# Altium schematic symbol library Diodes - TVS.SchLib: 5379 symbols (part 8 of 35)
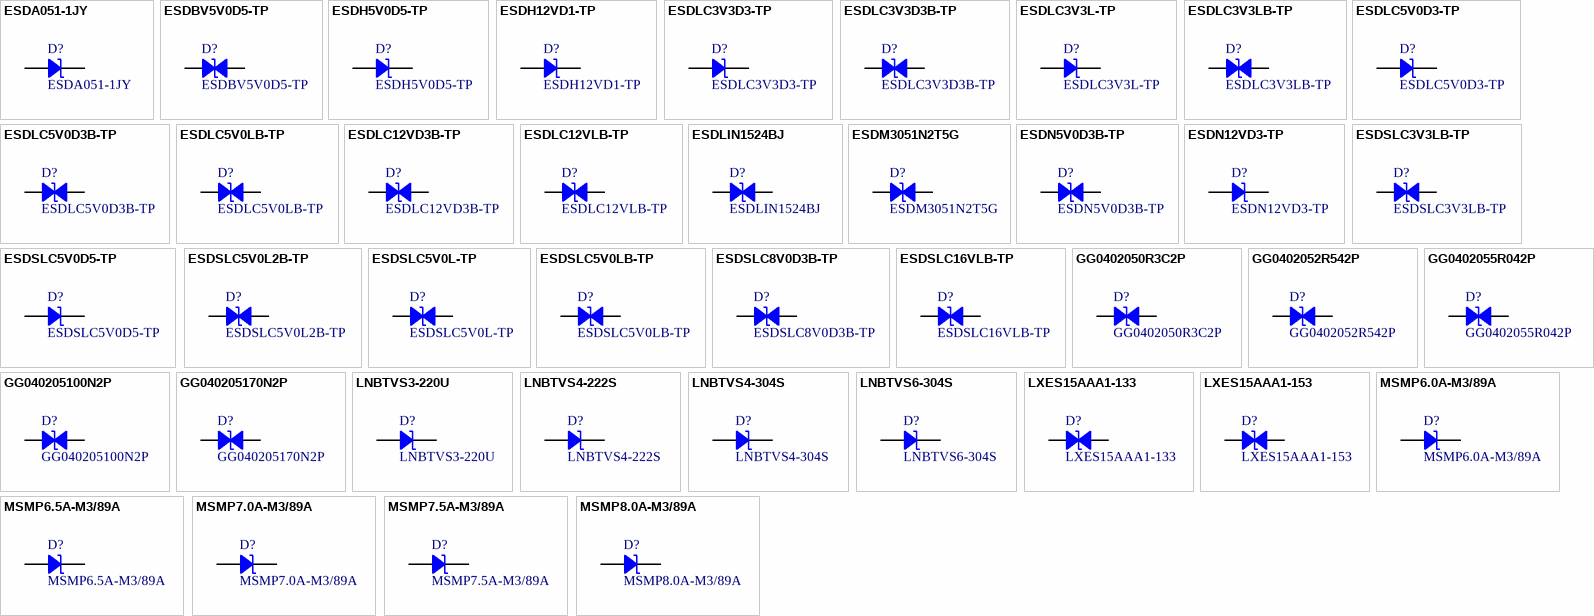
[diagram p141: symbols ESDA051-1JY to MSMP8.0A-M3/89A]

## MSMP8.0A-M3/89A
designator D?
TVS DIODE 8VWM 13.6VC MICROSMP; Manufacturer: Vishay Semiconductor Diodes Division; Current - Peak Pulse (10/1000µs): 11A; Power Line Protection: No; Power - Peak Pulse: 150W; Type: Zener; Unidirectional Channels: 1; Voltage - Breakdown (Min): 8.89V; Voltage - Clamping (Max) @ Ipp: 13.6V; Voltage - Reverse Standoff (Typ): 8V; Part Number: MSMP8.0A-M3/89A; Applications: General Purpose; ComponentLink1Description: Datasheet; ComponentLink1URL: http://www.vishay.com/docs/89457/msmp6athrumsmp20a.pdf; ComponentLink2Description: DigiKey Link; ComponentLink2URL: http://digikey.com/product-detail/en/vishay-semiconductor-diodes-division/MSMP8.0A-M3-89A/MSMP8.0A-M3-89AGICT-ND/8535698; Device Package: MicroSMP; LastUpdated: 9/2/2020 1:28:32 AM; Lifecycle Status: Active; Minimum Order: 1; Mounting Type: Surface Mount; Operating Temperature: -55°C ~ 150°C (TJ); Package / Case: MicroSMP; Packaging: TapeAndReel; PartId: 10006; Part Status: Active; Price: 0.07; Series: TransZorb®; Supplier 1: DigiKey; Supplier Part Number 1: MSMP8.0A-M3/89AGICT-ND; Supplier Device Package: MicroSMP
footprint DO-219AD MicroSMP
pins: 1, 2

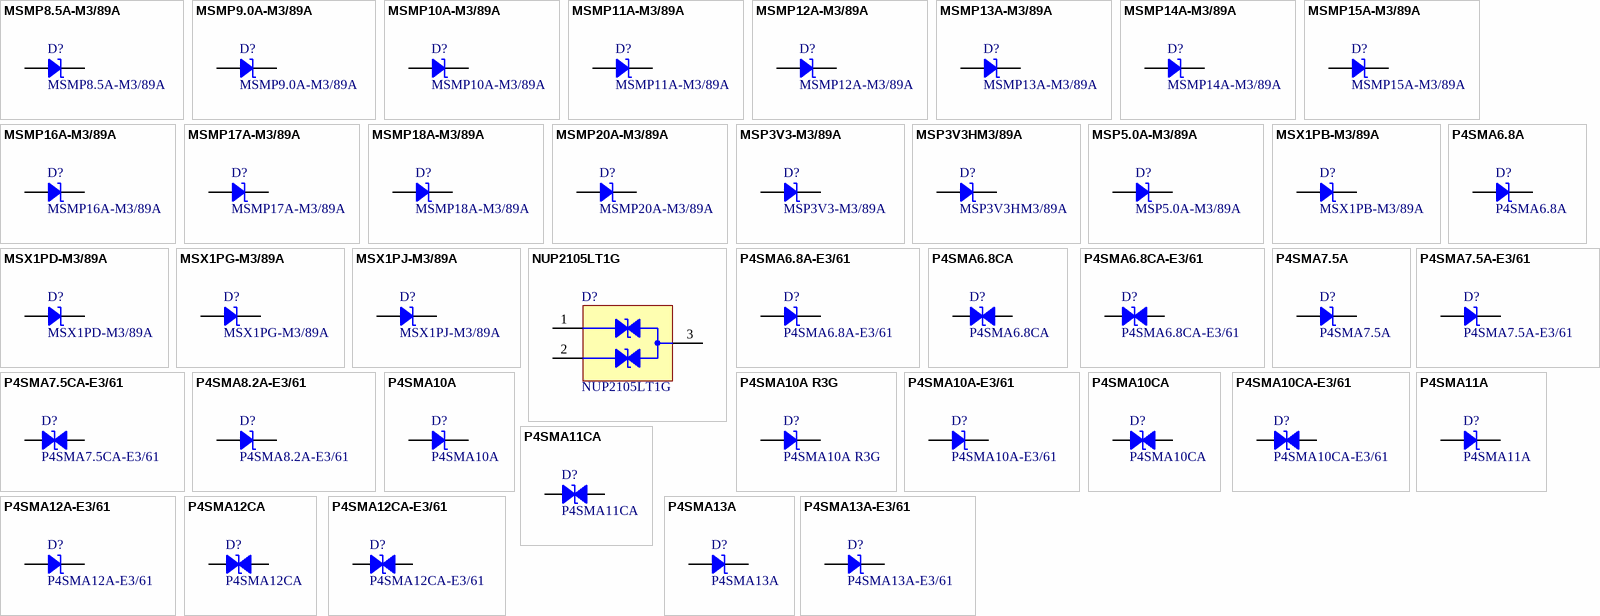
[diagram p26: symbols MSMP8.5A-M3/89A to P4SMA13A-E3/61]

## MSMP8.5A-M3/89A
designator D?
TVS DIODE 8.5VWM 14.4VC MICROSMP; Manufacturer: Vishay Semiconductor Diodes Division; Current - Peak Pulse (10/1000µs): 10.4A; Power Line Protection: No; Power - Peak Pulse: 150W; Type: Zener; Unidirectional Channels: 1; Voltage - Breakdown (Min): 9.44V; Voltage - Clamping (Max) @ Ipp: 14.4V; Voltage - Reverse Standoff (Typ): 8.5V; Part Number: MSMP8.5A-M3/89A; Applications: General Purpose; ComponentLink1Description: Datasheet; ComponentLink1URL: http://www.vishay.com/docs/89457/msmp6athrumsmp20a.pdf; ComponentLink2Description: DigiKey Link; ComponentLink2URL: http://digikey.com/product-detail/en/vishay-semiconductor-diodes-division/MSMP8.5A-M3-89A/MSMP8.5A-M3-89AGICT-ND/8535699; Device Package: MicroSMP; LastUpdated: 9/2/2020 1:28:32 AM; Lifecycle Status: Active; Minimum Order: 1; Mounting Type: Surface Mount; Operating Temperature: -55°C ~ 150°C (TJ); Package / Case: MicroSMP; Packaging: TapeAndReel; PartId: 10010; Part Status: Active; Price: 0.06; Series: TransZorb®; Supplier 1: DigiKey; Supplier Part Number 1: MSMP8.5A-M3/89AGICT-ND; Supplier Device Package: MicroSMP
footprint DO-219AD MicroSMP
pins: 1, 2

## MSMP9.0A-M3/89A
designator D?
TVS DIODE 9VWM 15.4VC MICROSMP; Manufacturer: Vishay Semiconductor Diodes Division; Current - Peak Pulse (10/1000µs): 9.7A; Power Line Protection: No; Power - Peak Pulse: 150W; Type: Zener; Unidirectional Channels: 1; Voltage - Breakdown (Min): 10V; Voltage - Clamping (Max) @ Ipp: 15.4V; Voltage - Reverse Standoff (Typ): 9V; Part Number: MSMP9.0A-M3/89A; Applications: General Purpose; ComponentLink1Description: Datasheet; ComponentLink1URL: http://www.vishay.com/docs/89457/msmp6athrumsmp20a.pdf; ComponentLink2Description: DigiKey Link; ComponentLink2URL: http://digikey.com/product-detail/en/vishay-semiconductor-diodes-division/MSMP9.0A-M3-89A/MSMP9.0A-M3-89AGICT-ND/8535700; Device Package: MicroSMP; LastUpdated: 9/2/2020 1:28:32 AM; Lifecycle Status: Active; Minimum Order: 1; Mounting Type: Surface Mount; Operating Temperature: -55°C ~ 150°C (TJ); Package / Case: MicroSMP; Packaging: TapeAndReel; PartId: 10009; Part Status: Active; Price: 0.06; Series: TransZorb®; Supplier 1: DigiKey; Supplier Part Number 1: MSMP9.0A-M3/89AGICT-ND; Supplier Device Package: MicroSMP
footprint DO-219AD MicroSMP
pins: 1, 2

## MSMP10A-M3/89A
designator D?
TVS DIODE 10VWM 17VC MICROSMP; Manufacturer: Vishay Semiconductor Diodes Division; Current - Peak Pulse (10/1000µs): 8.8A; Power Line Protection: No; Power - Peak Pulse: 150W; Type: Zener; Unidirectional Channels: 1; Voltage - Breakdown (Min): 11.1V; Voltage - Clamping (Max) @ Ipp: 17V; Voltage - Reverse Standoff (Typ): 10V; Part Number: MSMP10A-M3/89A; Applications: General Purpose; ComponentLink1Description: Datasheet; ComponentLink1URL: http://www.vishay.com/docs/89457/msmp6athrumsmp20a.pdf; ComponentLink2Description: DigiKey Link; ComponentLink2URL: http://digikey.com/product-detail/en/vishay-semiconductor-diodes-division/MSMP10A-M3-89A/MSMP10A-M3-89AGICT-ND/8535684; Device Package: MicroSMP; LastUpdated: 9/2/2020 1:28:32 AM; Lifecycle Status: Active; Minimum Order: 1; Mounting Type: Surface Mount; Operating Temperature: -55°C ~ 150°C (TJ); Package / Case: MicroSMP; Packaging: TapeAndReel; PartId: 10017; Part Status: Active; Price: 0.06; Series: TransZorb®; Supplier 1: DigiKey; Supplier Part Number 1: MSMP10A-M3/89AGICT-ND; Supplier Device Package: MicroSMP
footprint DO-219AD MicroSMP
pins: 1, 2

## MSMP11A-M3/89A
designator D?
TVS DIODE 11VWM 18.2VC MICROSMP; Manufacturer: Vishay Semiconductor Diodes Division; Current - Peak Pulse (10/1000µs): 8.2A; Power Line Protection: No; Power - Peak Pulse: 150W; Type: Zener; Unidirectional Channels: 1; Voltage - Breakdown (Min): 12.2V; Voltage - Clamping (Max) @ Ipp: 18.2V; Voltage - Reverse Standoff (Typ): 11V; Part Number: MSMP11A-M3/89A; Applications: General Purpose; ComponentLink1Description: Datasheet; ComponentLink1URL: http://www.vishay.com/docs/89457/msmp6athrumsmp20a.pdf; ComponentLink2Description: DigiKey Link; ComponentLink2URL: http://digikey.com/product-detail/en/vishay-semiconductor-diodes-division/MSMP11A-M3-89A/MSMP11A-M3-89AGICT-ND/8535685; Device Package: MicroSMP; LastUpdated: 9/2/2020 1:28:32 AM; Lifecycle Status: Active; Minimum Order: 1; Mounting Type: Surface Mount; Operating Temperature: -55°C ~ 150°C (TJ); Package / Case: MicroSMP; Packaging: TapeAndReel; PartId: 10019; Part Status: Active; Price: 0.06; Series: TransZorb®; Supplier 1: DigiKey; Supplier Part Number 1: MSMP11A-M3/89AGICT-ND; Supplier Device Package: MicroSMP
footprint DO-219AD MicroSMP
pins: 1, 2

## MSMP12A-M3/89A
designator D?
TVS DIODE 12VWM 19.9VC MICROSMP; Manufacturer: Vishay Semiconductor Diodes Division; Current - Peak Pulse (10/1000µs): 7.5A; Power Line Protection: No; Power - Peak Pulse: 150W; Type: Zener; Unidirectional Channels: 1; Voltage - Breakdown (Min): 13.3V; Voltage - Clamping (Max) @ Ipp: 19.9V; Voltage - Reverse Standoff (Typ): 12V; Part Number: MSMP12A-M3/89A; Applications: General Purpose; ComponentLink1Description: Datasheet; ComponentLink1URL: http://www.vishay.com/docs/89457/msmp6athrumsmp20a.pdf; ComponentLink2Description: DigiKey Link; ComponentLink2URL: http://digikey.com/product-detail/en/vishay-semiconductor-diodes-division/MSMP12A-M3-89A/MSMP12A-M3-89AGICT-ND/8535686; Device Package: MicroSMP; LastUpdated: 9/2/2020 1:28:32 AM; Lifecycle Status: Active; Minimum Order: 1; Mounting Type: Surface Mount; Operating Temperature: -55°C ~ 150°C (TJ); Package / Case: MicroSMP; Packaging: TapeAndReel; PartId: 10016; Part Status: Active; Price: 0.06; Series: TransZorb®; Supplier 1: DigiKey; Supplier Part Number 1: MSMP12A-M3/89AGICT-ND; Supplier Device Package: MicroSMP
footprint DO-219AD MicroSMP
pins: 1, 2

## MSMP13A-M3/89A
designator D?
TVS DIODE 13VWM 21.5VC MICROSMP; Manufacturer: Vishay Semiconductor Diodes Division; Current - Peak Pulse (10/1000µs): 7A; Power Line Protection: No; Power - Peak Pulse: 150W; Type: Zener; Unidirectional Channels: 1; Voltage - Breakdown (Min): 14.4V; Voltage - Clamping (Max) @ Ipp: 21.5V; Voltage - Reverse Standoff (Typ): 13V; Part Number: MSMP13A-M3/89A; Applications: General Purpose; ComponentLink1Description: Datasheet; ComponentLink1URL: http://www.vishay.com/docs/89457/msmp6athrumsmp20a.pdf; ComponentLink2Description: DigiKey Link; ComponentLink2URL: http://digikey.com/product-detail/en/vishay-semiconductor-diodes-division/MSMP13A-M3-89A/MSMP13A-M3-89AGICT-ND/8535687; Device Package: MicroSMP; LastUpdated: 9/2/2020 1:28:32 AM; Lifecycle Status: Active; Minimum Order: 1; Mounting Type: Surface Mount; Operating Temperature: -55°C ~ 150°C (TJ); Package / Case: MicroSMP; Packaging: TapeAndReel; PartId: 10015; Part Status: Active; Price: 0.06; Series: TransZorb®; Supplier 1: DigiKey; Supplier Part Number 1: MSMP13A-M3/89AGICT-ND; Supplier Device Package: MicroSMP
footprint DO-219AD MicroSMP
pins: 1, 2

## MSMP14A-M3/89A
designator D?
TVS DIODE 14VWM 23.2VC MICROSMP; Manufacturer: Vishay Semiconductor Diodes Division; Current - Peak Pulse (10/1000µs): 6.5A; Power Line Protection: No; Power - Peak Pulse: 150W; Type: Zener; Unidirectional Channels: 1; Voltage - Breakdown (Min): 15.6V; Voltage - Clamping (Max) @ Ipp: 23.2V; Voltage - Reverse Standoff (Typ): 14V; Part Number: MSMP14A-M3/89A; Applications: General Purpose; ComponentLink1Description: Datasheet; ComponentLink1URL: http://www.vishay.com/docs/89457/msmp6athrumsmp20a.pdf; ComponentLink2Description: DigiKey Link; ComponentLink2URL: http://digikey.com/product-detail/en/vishay-semiconductor-diodes-division/MSMP14A-M3-89A/MSMP14A-M3-89AGICT-ND/8535688; Device Package: MicroSMP; LastUpdated: 9/2/2020 1:28:32 AM; Lifecycle Status: Active; Minimum Order: 1; Mounting Type: Surface Mount; Operating Temperature: -55°C ~ 150°C (TJ); Package / Case: MicroSMP; Packaging: TapeAndReel; PartId: 10014; Part Status: Active; Price: 0.06; Series: TransZorb®; Supplier 1: DigiKey; Supplier Part Number 1: MSMP14A-M3/89AGICT-ND; Supplier Device Package: MicroSMP
footprint DO-219AD MicroSMP
pins: 1, 2

## MSMP15A-M3/89A
designator D?
TVS DIODE 15VWM 24.4VC MICROSMP; Manufacturer: Vishay Semiconductor Diodes Division; Current - Peak Pulse (10/1000µs): 6.2A; Power Line Protection: No; Power - Peak Pulse: 150W; Type: Zener; Unidirectional Channels: 1; Voltage - Breakdown (Min): 16.7V; Voltage - Clamping (Max) @ Ipp: 24.4V; Voltage - Reverse Standoff (Typ): 15V; Part Number: MSMP15A-M3/89A; Applications: General Purpose; ComponentLink1Description: Datasheet; ComponentLink1URL: http://www.vishay.com/docs/89457/msmp6athrumsmp20a.pdf; ComponentLink2Description: DigiKey Link; ComponentLink2URL: http://digikey.com/product-detail/en/vishay-semiconductor-diodes-division/MSMP15A-M3-89A/MSMP15A-M3-89AGICT-ND/8535689; Device Package: MicroSMP; LastUpdated: 9/2/2020 1:28:32 AM; Lifecycle Status: Active; Minimum Order: 1; Mounting Type: Surface Mount; Operating Temperature: -55°C ~ 150°C (TJ); Package / Case: MicroSMP; Packaging: TapeAndReel; PartId: 10013; Part Status: Active; Price: 0.06; Series: TransZorb®; Supplier 1: DigiKey; Supplier Part Number 1: MSMP15A-M3/89AGICT-ND; Supplier Device Package: MicroSMP
footprint DO-219AD MicroSMP
pins: 1, 2

## MSMP16A-M3/89A
designator D?
TVS DIODE 16VWM 26VC MICROSMP; Manufacturer: Vishay Semiconductor Diodes Division; Current - Peak Pulse (10/1000µs): 5.8A; Power Line Protection: No; Power - Peak Pulse: 150W; Type: Zener; Unidirectional Channels: 1; Voltage - Breakdown (Min): 17.8V; Voltage - Clamping (Max) @ Ipp: 26V; Voltage - Reverse Standoff (Typ): 16V; Part Number: MSMP16A-M3/89A; Applications: General Purpose; ComponentLink1Description: Datasheet; ComponentLink1URL: http://www.vishay.com/docs/89457/msmp6athrumsmp20a.pdf; ComponentLink2Description: DigiKey Link; ComponentLink2URL: http://digikey.com/product-detail/en/vishay-semiconductor-diodes-division/MSMP16A-M3-89A/MSMP16A-M3-89AGICT-ND/8535690; Device Package: MicroSMP; LastUpdated: 9/2/2020 1:28:32 AM; Lifecycle Status: Active; Minimum Order: 1; Mounting Type: Surface Mount; Operating Temperature: -55°C ~ 150°C (TJ); Package / Case: MicroSMP; Packaging: TapeAndReel; PartId: 10012; Part Status: Active; Price: 0.06; Series: TransZorb®; Supplier 1: DigiKey; Supplier Part Number 1: MSMP16A-M3/89AGICT-ND; Supplier Device Package: MicroSMP
footprint DO-219AD MicroSMP
pins: 1, 2

## MSMP17A-M3/89A
designator D?
TVS DIODE 17VWM 27.6VC MICROSMP; Manufacturer: Vishay Semiconductor Diodes Division; Current - Peak Pulse (10/1000µs): 5.4A; Power Line Protection: No; Power - Peak Pulse: 150W; Type: Zener; Unidirectional Channels: 1; Voltage - Breakdown (Min): 18.9V; Voltage - Clamping (Max) @ Ipp: 27.6V; Voltage - Reverse Standoff (Typ): 17V; Part Number: MSMP17A-M3/89A; Applications: General Purpose; ComponentLink1Description: Datasheet; ComponentLink1URL: http://www.vishay.com/docs/89457/msmp6athrumsmp20a.pdf; ComponentLink2Description: DigiKey Link; ComponentLink2URL: http://digikey.com/product-detail/en/vishay-semiconductor-diodes-division/MSMP17A-M3-89A/MSMP17A-M3-89AGICT-ND/8535691; Device Package: MicroSMP; LastUpdated: 9/2/2020 1:28:32 AM; Lifecycle Status: Active; Minimum Order: 1; Mounting Type: Surface Mount; Operating Temperature: -55°C ~ 150°C (TJ); Package / Case: MicroSMP; Packaging: TapeAndReel; PartId: 10011; Part Status: Active; Price: 0.06; Series: TransZorb®; Supplier 1: DigiKey; Supplier Part Number 1: MSMP17A-M3/89AGICT-ND; Supplier Device Package: MicroSMP
footprint DO-219AD MicroSMP
pins: 1, 2

## MSMP18A-M3/89A
designator D?
TVS DIODE 18VWM 29.2VC MICROSMP; Manufacturer: Vishay Semiconductor Diodes Division; Current - Peak Pulse (10/1000µs): 5.1A; Power Line Protection: No; Power - Peak Pulse: 150W; Type: Zener; Unidirectional Channels: 1; Voltage - Breakdown (Min): 20V; Voltage - Clamping (Max) @ Ipp: 29.2V; Voltage - Reverse Standoff (Typ): 18V; Part Number: MSMP18A-M3/89A; Applications: General Purpose; ComponentLink1Description: Datasheet; ComponentLink1URL: http://www.vishay.com/docs/89457/msmp6athrumsmp20a.pdf; ComponentLink2Description: DigiKey Link; ComponentLink2URL: http://digikey.com/product-detail/en/vishay-semiconductor-diodes-division/MSMP18A-M3-89A/MSMP18A-M3-89AGICT-ND/8535692; Device Package: MicroSMP; LastUpdated: 9/2/2020 1:28:32 AM; Lifecycle Status: Active; Minimum Order: 1; Mounting Type: Surface Mount; Operating Temperature: -55°C ~ 150°C (TJ); Package / Case: MicroSMP; Packaging: TapeAndReel; PartId: 10020; Part Status: Active; Price: 0.06; Series: TransZorb®; Supplier 1: DigiKey; Supplier Part Number 1: MSMP18A-M3/89AGICT-ND; Supplier Device Package: MicroSMP
footprint DO-219AD MicroSMP
pins: 1, 2

## MSMP20A-M3/89A
designator D?
TVS DIODE 20VWM 32.4VC MICROSMP; Manufacturer: Vishay Semiconductor Diodes Division; Current - Peak Pulse (10/1000µs): 4.6A; Power Line Protection: No; Power - Peak Pulse: 150W; Type: Zener; Unidirectional Channels: 1; Voltage - Breakdown (Min): 22.2V; Voltage - Clamping (Max) @ Ipp: 32.4V; Voltage - Reverse Standoff (Typ): 20V; Part Number: MSMP20A-M3/89A; Applications: General Purpose; ComponentLink1Description: Datasheet; ComponentLink1URL: http://www.vishay.com/docs/89457/msmp6athrumsmp20a.pdf; ComponentLink2Description: DigiKey Link; ComponentLink2URL: http://digikey.com/product-detail/en/vishay-semiconductor-diodes-division/MSMP20A-M3-89A/MSMP20A-M3-89AGICT-ND/8535693; Device Package: MicroSMP; LastUpdated: 9/2/2020 1:28:32 AM; Lifecycle Status: Active; Minimum Order: 1; Mounting Type: Surface Mount; Operating Temperature: -55°C ~ 150°C (TJ); Package / Case: MicroSMP; Packaging: TapeAndReel; PartId: 10018; Part Status: Active; Price: 0.06; Series: TransZorb®; Supplier 1: DigiKey; Supplier Part Number 1: MSMP20A-M3/89AGICT-ND; Supplier Device Package: MicroSMP
footprint DO-219AD MicroSMP
pins: 1, 2

## MSP3V3-M3/89A
designator D?
TVS DIODE 3.3V 11.5V MICROSMP; Manufacturer: Vishay Semiconductor Diodes Division; Current - Peak Pulse (10/1000µs): 87A (8/20µs); Power Line Protection: No; Power - Peak Pulse: 150W; Type: Zener; Unidirectional Channels: 1; Voltage - Breakdown (Min): 4.1V; Part Number: MSP3V3-M3/89A; Applications: General Purpose; ComponentLink1Description: Datasheet; ComponentLink1URL: http://www.vishay.com/docs/88486/msp3v3.pdf; ComponentLink2Description: DigiKey Link; ComponentLink2URL: http://digikey.com/product-detail/en/vishay-semiconductor-diodes-division/MSP3V3-M3-89A/MSP3V3-M3-89AGICT-ND/2071756; LastUpdated: 9/2/2020 1:28:32 AM; Lifecycle Status: Active; Minimum Order: 1; Mounting Type: Surface Mount; Operating Temperature: -55°C ~ 150°C (TJ); Package / Case: DO-219AD; Packaging: TapeAndReel; PartId: 10002; Part Status: Active; Price: 0.06; Series: TransZorb®, eSMP®; Supplier 1: DigiKey; Supplier Part Number 1: MSP3V3-M3/89AGICT-ND; Supplier Device Package: MicroSMP (DO-219AD); Voltage - Clamping (Max) @ Ipp: 11.5V; Voltage - Reverse Standoff (Typ): 3.3V
footprint DO-219AD MicroSMP
pins: 1, 2

## MSP3V3HM3/89A
designator D?
TVS DIODE 3.3V 11.5V MICROSMP; Manufacturer: Vishay Semiconductor Diodes Division; Current - Peak Pulse (10/1000µs): 87A (8/20µs); Power Line Protection: No; Power - Peak Pulse: 150W; Type: Zener; Unidirectional Channels: 1; Voltage - Breakdown (Min): 4.1V; Part Number: MSP3V3HM3/89A; Applications: Automotive; ComponentLink1Description: Datasheet; ComponentLink1URL: http://www.vishay.com/docs/88486/msp3v3.pdf; ComponentLink2Description: DigiKey Link; ComponentLink2URL: http://digikey.com/product-detail/en/vishay-semiconductor-diodes-division/MSP3V3HM3-89A/MSP3V3HM3-89AGICT-ND/8284101; LastUpdated: 9/2/2020 1:28:32 AM; Lifecycle Status: Active; Minimum Order: 1; Mounting Type: Surface Mount; Operating Temperature: -55°C ~ 150°C (TJ); Package / Case: DO-219AD; Packaging: TapeAndReel; PartId: 9997; Part Status: Active; Price: 0.07; Series: Automotive, AEC-Q101, TransZorb®, eSMP™; Supplier 1: DigiKey; Supplier Part Number 1: MSP3V3HM3/89AGICT-ND; Supplier Device Package: MicroSMP (DO-219AD); Voltage - Clamping (Max) @ Ipp: 11.5V; Voltage - Reverse Standoff (Typ): 3.3V
footprint DO-219AD MicroSMP
pins: 1, 2

## MSP5.0A-M3/89A
designator D?
TVS DIODE 5V 10.9V MICROSMP; Manufacturer: Vishay Semiconductor Diodes Division; Current - Peak Pulse (10/1000µs): 10.9A; Power Line Protection: No; Power - Peak Pulse: 100W; Type: Zener; Unidirectional Channels: 1; Voltage - Breakdown (Min): 6.4V; Part Number: MSP5.0A-M3/89A; Applications: General Purpose; ComponentLink1Description: Datasheet; ComponentLink1URL: //media.digikey.com/pdf/Data%20Sheets/Vishay%20Semiconductors/MSP5.0A.pdf; ComponentLink2Description: DigiKey Link; ComponentLink2URL: http://digikey.com/product-detail/en/vishay-semiconductor-diodes-division/MSP5.0A-M3-89A/MSP5.0A-M3-89AGICT-ND/2071757; Device Package: MicroSMP; LastUpdated: 9/2/2020 1:28:32 AM; Lifecycle Status: Active; Minimum Order: 1; Mounting Type: Surface Mount; Operating Temperature: -55°C ~ 150°C (TJ); Package / Case: MicroSMP; Packaging: TapeAndReel; PartId: 10003; Part Status: Active; Price: 0.07; Series: TransZorb®, eSMP®; Supplier 1: DigiKey; Supplier Part Number 1: MSP5.0A-M3/89AGICT-ND; Supplier Device Package: MicroSMP; Voltage - Clamping (Max) @ Ipp: 10.9V; Voltage - Reverse Standoff (Typ): 5V
footprint DO-219AD MicroSMP
pins: 1, 2

## MSX1PB-M3/89A
designator D?
TVS DIODE 100V MICROSMP; Manufacturer: Vishay Semiconductor Diodes Division; Power Line Protection: No; Type: Zener; Unidirectional Channels: 1; Part Number: MSX1PB-M3/89A; Applications: General Purpose; ComponentLink1Description: Datasheet; ComponentLink1URL: http://www.vishay.com/docs/87726/msx1pb-msx1pd-msx1pg-msx1pj.pdf; ComponentLink2Description: DigiKey Link; ComponentLink2URL: http://digikey.com/product-detail/en/vishay-semiconductor-diodes-division/MSX1PB-M3-89A/MSX1PB-M3-89AGICT-ND/8535701; LastUpdated: 9/2/2020 1:28:32 AM; Lifecycle Status: Active; Minimum Order: 1; Mounting Type: Surface Mount; Operating Temperature: -55°C ~ 175°C (TJ); Package / Case: DO-219AD; Packaging: TapeAndReel; PartId: 9998; Part Status: Active; Price: 0.07; Series: eSMP®; Supplier 1: DigiKey; Supplier Part Number 1: MSX1PB-M3/89AGICT-ND; Supplier Device Package: MicroSMP (DO-219AD); Voltage - Reverse Standoff (Typ): 100V
footprint DO-219AD MicroSMP
pins: 1, 2

## MSX1PD-M3/89A
designator D?
TVS DIODE 200VWM; Manufacturer: Vishay Semiconductor Diodes Division; Power Line Protection: No; Type: Zener; Unidirectional Channels: 1; Voltage - Reverse Standoff (Typ): 200V; Part Number: MSX1PD-M3/89A; Applications: General Purpose; ComponentLink1Description: Datasheet; ComponentLink1URL: http://www.vishay.com/docs/87726/msx1pb-msx1pd-msx1pg-msx1pj.pdf; ComponentLink2Description: DigiKey Link; ComponentLink2URL: http://digikey.com/product-detail/en/vishay-semiconductor-diodes-division/MSX1PD-M3-89A/MSX1PD-M3-89AGICT-ND/8535702; LastUpdated: 9/2/2020 1:28:32 AM; Lifecycle Status: Active; Minimum Order: 1; Mounting Type: Surface Mount; Operating Temperature: -55°C ~ 175°C (TJ); Package / Case: DO-219AD; Packaging: TapeAndReel; PartId: 10005; Part Status: Active; Price: 0.07; Series: eSMP®; Supplier 1: DigiKey; Supplier Part Number 1: MSX1PD-M3/89AGICT-ND; Supplier Device Package: MicroSMP (DO-219AD)
footprint DO-219AD MicroSMP
pins: 1, 2

## MSX1PG-M3/89A
designator D?
TVS DIODE 400VWM; Manufacturer: Vishay Semiconductor Diodes Division; Power Line Protection: No; Type: Zener; Unidirectional Channels: 1; Voltage - Reverse Standoff (Typ): 400V; Part Number: MSX1PG-M3/89A; Applications: General Purpose; ComponentLink1Description: Datasheet; ComponentLink1URL: http://www.vishay.com/docs/87726/msx1pb-msx1pd-msx1pg-msx1pj.pdf; ComponentLink2Description: DigiKey Link; ComponentLink2URL: http://digikey.com/product-detail/en/vishay-semiconductor-diodes-division/MSX1PG-M3-89A/MSX1PG-M3-89AGICT-ND/8535703; LastUpdated: 9/2/2020 1:28:32 AM; Lifecycle Status: Active; Minimum Order: 1; Mounting Type: Surface Mount; Operating Temperature: -55°C ~ 175°C (TJ); Package / Case: DO-219AD; Packaging: TapeAndReel; PartId: 10004; Part Status: Active; Price: 0.07; Series: eSMP®; Supplier 1: DigiKey; Supplier Part Number 1: MSX1PG-M3/89AGICT-ND; Supplier Device Package: MicroSMP (DO-219AD)
footprint DO-219AD MicroSMP
pins: 1, 2

## MSX1PJ-M3/89A
designator D?
TVS DIODE 600VWM; Manufacturer: Vishay Semiconductor Diodes Division; Power Line Protection: No; Type: Zener; Unidirectional Channels: 1; Voltage - Reverse Standoff (Typ): 600V; Part Number: MSX1PJ-M3/89A; Applications: General Purpose; ComponentLink1Description: Datasheet; ComponentLink1URL: http://www.vishay.com/docs/87726/msx1pb-msx1pd-msx1pg-msx1pj.pdf; ComponentLink2Description: DigiKey Link; ComponentLink2URL: http://digikey.com/product-detail/en/vishay-semiconductor-diodes-division/MSX1PJ-M3-89A/MSX1PJ-M3-89AGICT-ND/8535704; LastUpdated: 9/2/2020 1:28:32 AM; Lifecycle Status: Active; Minimum Order: 1; Mounting Type: Surface Mount; Operating Temperature: -55°C ~ 175°C (TJ); Package / Case: DO-219AD; Packaging: TapeAndReel; PartId: 9999; Part Status: Active; Price: 0.07; Series: eSMP®; Supplier 1: DigiKey; Supplier Part Number 1: MSX1PJ-M3/89AGICT-ND; Supplier Device Package: MicroSMP (DO-219AD)
footprint DO-219AD MicroSMP
pins: 1, 2

## NUP2105LT1G
designator D?
TVS DIODE 24V 44V SOT23-3; Manufacturer: ON Semiconductor; Bidirectional Channels: 2; Capacitance @ Frequency: 30pF @ 1MHz; Current - Peak Pulse (10/1000µs): 8A (8/20µs); Power Line Protection: No; Power - Peak Pulse: 350W; Type: Zener; Voltage - Breakdown (Min): 26.2V; Voltage - Reverse Standoff (Typ): 24V (Min); Part Number: NUP2105LT1G; Applications: General Purpose; ComponentLink1Description: Datasheet; ComponentLink1URL: http://www.onsemi.com/pub/Collateral/NUP2105L-D.PDF; ComponentLink2Description: DigiKey Link; ComponentLink2URL: http://digikey.com/product-detail/en/on-semiconductor/NUP2105LT1G/NUP2105LT1GOSCT-ND/1485001; Device Package: TO-236-3, SC-59, SOT-23-3; LastUpdated: 3/30/2020 4:33:57 PM; Lifecycle Status: Active; Minimum Order: 1; Mounting Type: Surface Mount; Operating Temperature: -55°C ~ 150°C (TJ); Package / Case: TO-236-3, SC-59, SOT-23-3; Packaging: TapeAndReel; PartId: 10506; Part Status: Active; Price: 0.09; Series: -; Supplier 1: DigiKey; Supplier Part Number 1: NUP2105LT1GOSCT-ND; Supplier Device Package: SOT-23-3 (TO-236); Voltage - Clamping (Max) @ Ipp: 44V
footprint ON SEMI SOT-23-3
pins: 1 I/O 1, 2 GND, 3 I/O 2

## P4SMA6.8A
designator D?
TVS DIODE 5.8V 10.5V DO214AC; Manufacturer: Bourns Inc.; Current - Peak Pulse (10/1000µs): 39A; Power Line Protection: No; Power - Peak Pulse: 400W; Type: Zener; Unidirectional Channels: 1; Voltage - Breakdown (Min): 6.45V; Part Number: P4SMA6.8A; Applications: General Purpose; ComponentLink1Description: Datasheet; ComponentLink1URL: https://www.bourns.com/docs/Product-Datasheets/P4SMA.pdf; ComponentLink2Description: DigiKey Link; ComponentLink2URL: http://digikey.com/product-detail/en/bourns-inc/P4SMA6.8A/P4SMA6.8ABBCT-ND/6181592; LastUpdated: 9/2/2020 1:20:14 AM; Lifecycle Status: Active; Minimum Order: 1; Mounting Type: Surface Mount; Operating Temperature: -55°C ~ 150°C (TJ); Package / Case: DO-214AC, SMA; Packaging: TapeAndReel; PartId: 5672; Part Status: Active; Price: 0.09; Series: -; Supplier 1: DigiKey; Supplier Part Number 1: P4SMA6.8ABBCT-ND; Supplier Device Package: DO-214AC (SMA); Voltage - Clamping (Max) @ Ipp: 10.5V; Voltage - Reverse Standoff (Typ): 5.8V
footprint DO214AC SMA
pins: 1, 2

## P4SMA6.8A-E3/61
designator D?
TVS DIODE 5.8V 10.5V DO214AC; Manufacturer: Vishay Semiconductor Diodes Division; Current - Peak Pulse (10/1000µs): 38.1A; Power Line Protection: No; Power - Peak Pulse: 400W; Type: Zener; Unidirectional Channels: 1; Voltage - Breakdown (Min): 6.45V; Part Number: P4SMA6.8A-E3/61; Applications: General Purpose; ComponentLink1Description: Datasheet; ComponentLink1URL: http://www.vishay.com/docs/88367/p4sma.pdf; ComponentLink2Description: DigiKey Link; ComponentLink2URL: http://digikey.com/product-detail/en/vishay-semiconductor-diodes-division/P4SMA6.8A-E3-61/P4SMA6.8A-E3-61GICT-ND/5639066; LastUpdated: 9/2/2020 1:20:15 AM; Lifecycle Status: Active; Minimum Order: 1; Mounting Type: Surface Mount; Operating Temperature: -65°C ~ 150°C (TJ); Package / Case: DO-214AC, SMA; Packaging: TapeAndReel; PartId: 5864; Part Status: Active; Price: 0.10; Series: P4SMA, TransZorb®; Supplier 1: DigiKey; Supplier Part Number 1: P4SMA6.8A-E3/61GICT-ND; Supplier Device Package: DO-214AC (SMA); Voltage - Clamping (Max) @ Ipp: 10.5V; Voltage - Reverse Standoff (Typ): 5.8V
footprint DO214AC SMA
pins: 1, 2

## P4SMA6.8CA
designator D?
TVS DIODE 5.8V 10.5V DO214AC; Manufacturer: Bourns Inc.; Bidirectional Channels: 1; Current - Peak Pulse (10/1000µs): 39A; Power Line Protection: No; Power - Peak Pulse: 400W; Type: Zener; Voltage - Breakdown (Min): 6.45V; Part Number: P4SMA6.8CA; Applications: General Purpose; ComponentLink1Description: Datasheet; ComponentLink1URL: https://www.bourns.com/docs/Product-Datasheets/P4SMA.pdf; ComponentLink2Description: DigiKey Link; ComponentLink2URL: http://digikey.com/product-detail/en/bourns-inc/P4SMA6.8CA/P4SMA6.8CABBCT-ND/6708223; LastUpdated: 9/2/2020 1:27:51 AM; Lifecycle Status: Active; Minimum Order: 1; Mounting Type: Surface Mount; Operating Temperature: -55°C ~ 150°C (TJ); Package / Case: DO-214AC, SMA; Packaging: TapeAndReel; PartId: 7340; Part Status: Active; Price: 0.09; Series: -; Supplier 1: DigiKey; Supplier Part Number 1: P4SMA6.8CABBCT-ND; Supplier Device Package: DO-214AC (SMA); Voltage - Clamping (Max) @ Ipp: 10.5V; Voltage - Reverse Standoff (Typ): 5.8V
footprint DO214AC SMA
pins: 1, 2

## P4SMA6.8CA-E3/61
designator D?
TVS DIODE 5.8V 10.5V DO214AC; Manufacturer: Vishay Semiconductor Diodes Division; Bidirectional Channels: 1; Current - Peak Pulse (10/1000µs): 38.1A; Power Line Protection: No; Power - Peak Pulse: 400W; Type: Zener; Voltage - Breakdown (Min): 6.45V; Part Number: P4SMA6.8CA-E3/61; Applications: General Purpose; ComponentLink1Description: Datasheet; ComponentLink1URL: http://www.vishay.com/docs/88367/p4sma.pdf; ComponentLink2Description: DigiKey Link; ComponentLink2URL: http://digikey.com/product-detail/en/vishay-semiconductor-diodes-division/P4SMA6.8CA-E3-61/P4SMA6.8CA-E3-61GICT-ND/5639067; LastUpdated: 9/2/2020 1:27:50 AM; Lifecycle Status: Active; Minimum Order: 1; Mounting Type: Surface Mount; Operating Temperature: -65°C ~ 150°C (TJ); Package / Case: DO-214AC, SMA; Packaging: TapeAndReel; PartId: 7286; Part Status: Active; Price: 0.11; Series: P4SMA, TransZorb®; Supplier 1: DigiKey; Supplier Part Number 1: P4SMA6.8CA-E3/61GICT-ND; Supplier Device Package: DO-214AC (SMA); Voltage - Clamping (Max) @ Ipp: 10.5V; Voltage - Reverse Standoff (Typ): 5.8V
footprint DO214AC SMA
pins: 1, 2

## P4SMA7.5A
designator D?
TVS DIODE 6.4V 11.3V DO214AC; Manufacturer: Bourns Inc.; Current - Peak Pulse (10/1000µs): 36.3A; Power Line Protection: No; Power - Peak Pulse: 400W; Type: Zener; Unidirectional Channels: 1; Voltage - Breakdown (Min): 7.13V; Part Number: P4SMA7.5A; Applications: General Purpose; ComponentLink1Description: Datasheet; ComponentLink1URL: https://www.bourns.com/docs/Product-Datasheets/P4SMA.pdf; ComponentLink2Description: DigiKey Link; ComponentLink2URL: http://digikey.com/product-detail/en/bourns-inc/P4SMA7.5A/P4SMA7.5ABBCT-ND/6708225; LastUpdated: 9/2/2020 1:20:14 AM; Lifecycle Status: Active; Minimum Order: 1; Mounting Type: Surface Mount; Operating Temperature: -55°C ~ 150°C (TJ); Package / Case: DO-214AC, SMA; Packaging: TapeAndReel; PartId: 5662; Part Status: Active; Price: 0.09; Series: -; Supplier 1: DigiKey; Supplier Part Number 1: P4SMA7.5ABBCT-ND; Supplier Device Package: DO-214AC (SMA); Voltage - Clamping (Max) @ Ipp: 11.3V; Voltage - Reverse Standoff (Typ): 6.4V
footprint DO214AC SMA
pins: 1, 2

## P4SMA7.5A-E3/61
designator D?
TVS DIODE 6.4V 11.3V DO214AC; Manufacturer: Vishay Semiconductor Diodes Division; Current - Peak Pulse (10/1000µs): 35.4A; Power Line Protection: No; Power - Peak Pulse: 400W; Type: Zener; Unidirectional Channels: 1; Voltage - Breakdown (Min): 7.13V; Part Number: P4SMA7.5A-E3/61; Applications: General Purpose; ComponentLink1Description: Datasheet; ComponentLink1URL: http://www.vishay.com/docs/88367/p4sma.pdf; ComponentLink2Description: DigiKey Link; ComponentLink2URL: http://digikey.com/product-detail/en/vishay-semiconductor-diodes-division/P4SMA7.5A-E3-61/P4SMA7.5A-E3-61GICT-ND/5639072; LastUpdated: 9/2/2020 1:20:14 AM; Lifecycle Status: Active; Minimum Order: 1; Mounting Type: Surface Mount; Operating Temperature: -65°C ~ 150°C (TJ); Package / Case: DO-214AC, SMA; Packaging: TapeAndReel; PartId: 5682; Part Status: Active; Price: 0.10; Series: P4SMA, TransZorb®; Supplier 1: DigiKey; Supplier Part Number 1: P4SMA7.5A-E3/61GICT-ND; Supplier Device Package: DO-214AC (SMA); Voltage - Clamping (Max) @ Ipp: 11.3V; Voltage - Reverse Standoff (Typ): 6.4V
footprint DO214AC SMA
pins: 1, 2

## P4SMA7.5CA-E3/61
designator D?
TVS DIODE 6.4V 11.3V DO214AC; Manufacturer: Vishay Semiconductor Diodes Division; Bidirectional Channels: 1; Current - Peak Pulse (10/1000µs): 35.4A; Power Line Protection: No; Power - Peak Pulse: 400W; Type: Zener; Voltage - Breakdown (Min): 7.13V; Part Number: P4SMA7.5CA-E3/61; Applications: General Purpose; ComponentLink1Description: Datasheet; ComponentLink1URL: http://www.vishay.com/docs/88367/p4sma.pdf; ComponentLink2Description: DigiKey Link; ComponentLink2URL: http://digikey.com/product-detail/en/vishay-semiconductor-diodes-division/P4SMA7.5CA-E3-61/P4SMA7.5CA-E3-61GICT-ND/5639073; LastUpdated: 9/2/2020 1:27:51 AM; Lifecycle Status: Active; Minimum Order: 1; Mounting Type: Surface Mount; Operating Temperature: -65°C ~ 150°C (TJ); Package / Case: DO-214AC, SMA; Packaging: TapeAndReel; PartId: 7354; Part Status: Active; Price: 0.11; Series: P4SMA, TransZorb®; Supplier 1: DigiKey; Supplier Part Number 1: P4SMA7.5CA-E3/61GICT-ND; Supplier Device Package: DO-214AC (SMA); Voltage - Clamping (Max) @ Ipp: 11.3V; Voltage - Reverse Standoff (Typ): 6.4V
footprint DO214AC SMA
pins: 1, 2

## P4SMA8.2A-E3/61
designator D?
TVS DIODE 7.02V 12.1V DO214AC; Manufacturer: Vishay Semiconductor Diodes Division; Current - Peak Pulse (10/1000µs): 33.1A; Power Line Protection: No; Power - Peak Pulse: 400W; Type: Zener; Unidirectional Channels: 1; Voltage - Breakdown (Min): 7.79V; Part Number: P4SMA8.2A-E3/61; Applications: General Purpose; ComponentLink1Description: Datasheet; ComponentLink1URL: http://www.vishay.com/docs/88367/p4sma.pdf; ComponentLink2Description: DigiKey Link; ComponentLink2URL: http://digikey.com/product-detail/en/vishay-semiconductor-diodes-division/P4SMA8.2A-E3-61/P4SMA8.2A-E3-61GICT-ND/5639076; LastUpdated: 9/2/2020 1:20:13 AM; Lifecycle Status: Active; Minimum Order: 1; Mounting Type: Surface Mount; Operating Temperature: -65°C ~ 150°C (TJ); Package / Case: DO-214AC, SMA; Packaging: TapeAndReel; PartId: 5595; Part Status: Active; Price: 0.10; Series: P4SMA, TransZorb®; Supplier 1: DigiKey; Supplier Part Number 1: P4SMA8.2A-E3/61GICT-ND; Supplier Device Package: DO-214AC (SMA); Voltage - Clamping (Max) @ Ipp: 12.1V; Voltage - Reverse Standoff (Typ): 7.02V
footprint DO214AC SMA
pins: 1, 2

## P4SMA10A
designator D?
TVS DIODE 8.55V 14.5V DO214AC; Manufacturer: Littelfuse Inc.; Current - Peak Pulse (10/1000µs): 28.3A; Power Line Protection: No; Power - Peak Pulse: 400W; Type: Zener; Unidirectional Channels: 1; Voltage - Breakdown (Min): 9.5V; Part Number: P4SMA10A; Applications: General Purpose; ComponentLink1Description: Datasheet; ComponentLink1URL: https://www.littelfuse.com/~/media/electronics/datasheets/tvs_diodes/littelfuse_tvs_diode_p4sma_datasheet.pdf.pdf; ComponentLink2Description: DigiKey Link; ComponentLink2URL: http://digikey.com/product-detail/en/littelfuse-inc/P4SMA10A/P4SMA10ACT-ND/2770325; LastUpdated: 9/2/2020 1:20:16 AM; Lifecycle Status: Active; Minimum Order: 1; Mounting Type: Surface Mount; Operating Temperature: -65°C ~ 150°C (TJ); Package / Case: DO-214AC, SMA; Packaging: TapeAndReel; PartId: 5910; Part Status: Active; Price: 0.13; Series: P4SMA; Supplier 1: DigiKey; Supplier Part Number 1: P4SMA10ACT-ND; Supplier Device Package: DO-214AC (SMA); Voltage - Clamping (Max) @ Ipp: 14.5V; Voltage - Reverse Standoff (Typ): 8.55V
footprint DO214AC SMA
pins: 1, 2

## P4SMA10A R3G
designator D?
TVS DIODE 8.55V 14.5V DO214AC; Manufacturer: Taiwan Semiconductor Corporation; Current - Peak Pulse (10/1000µs): 29A; Power Line Protection: No; Power - Peak Pulse: 400W; Type: Zener; Unidirectional Channels: 1; Voltage - Breakdown (Min): 9.5V; Part Number: P4SMA10A R3G; Applications: General Purpose; ComponentLink1Description: Datasheet; ComponentLink1URL: https://www.taiwansemi.com/products/datasheet/P4SMA%20SERIES_Q1705.pdf; ComponentLink2Description: DigiKey Link; ComponentLink2URL: http://digikey.com/product-detail/en/taiwan-semiconductor-corporation/P4SMA10A-R3G/P4SMA10AR3GCT-ND/7644319; LastUpdated: 9/2/2020 1:20:12 AM; Lifecycle Status: Active; Minimum Order: 1; Mounting Type: Surface Mount; Operating Temperature: -55°C ~ 150°C (TJ); Package / Case: DO-214AC, SMA; Packaging: TapeAndReel; PartId: 5551; Part Status: Active; Price: 0.11; Series: P4SMA; Supplier 1: DigiKey; Supplier Part Number 1: P4SMA10AR3GCT-ND; Supplier Device Package: DO-214AC (SMA); Voltage - Clamping (Max) @ Ipp: 14.5V; Voltage - Reverse Standoff (Typ): 8.55V
footprint DO214AC SMA
pins: 1, 2

## P4SMA10A-E3/61
designator D?
TVS DIODE 8.55V 14.5V DO214AC; Manufacturer: Vishay Semiconductor Diodes Division; Current - Peak Pulse (10/1000µs): 27.6A; Power Line Protection: No; Power - Peak Pulse: 400W; Type: Zener; Unidirectional Channels: 1; Voltage - Breakdown (Min): 9.5V; Part Number: P4SMA10A-E3/61; Applications: General Purpose; ComponentLink1Description: Datasheet; ComponentLink1URL: http://www.vishay.com/docs/88367/p4sma.pdf; ComponentLink2Description: DigiKey Link; ComponentLink2URL: http://digikey.com/product-detail/en/vishay-semiconductor-diodes-division/P4SMA10A-E3-61/P4SMA10A-E3-61GICT-ND/5639016; LastUpdated: 9/2/2020 1:20:17 AM; Lifecycle Status: Active; Minimum Order: 1; Mounting Type: Surface Mount; Operating Temperature: -65°C ~ 150°C (TJ); Package / Case: DO-214AC, SMA; Packaging: TapeAndReel; PartId: 6080; Part Status: Active; Price: 0.10; Series: P4SMA, TransZorb®; Supplier 1: DigiKey; Supplier Part Number 1: P4SMA10A-E3/61GICT-ND; Supplier Device Package: DO-214AC (SMA); Voltage - Clamping (Max) @ Ipp: 14.5V; Voltage - Reverse Standoff (Typ): 8.55V
footprint DO214AC SMA
pins: 1, 2

## P4SMA10CA
designator D?
TVS DIODE 8.55V 14.5V DO214AC; Manufacturer: Bourns Inc.; Bidirectional Channels: 1; Current - Peak Pulse (10/1000µs): 28.3A; Power Line Protection: No; Power - Peak Pulse: 400W; Type: Zener; Voltage - Breakdown (Min): 9.5V; Part Number: P4SMA10CA; Applications: General Purpose; ComponentLink1Description: Datasheet; ComponentLink1URL: https://www.bourns.com/docs/Product-Datasheets/P4SMA.pdf; ComponentLink2Description: DigiKey Link; ComponentLink2URL: http://digikey.com/product-detail/en/bourns-inc/P4SMA10CA/P4SMA10CABBCT-ND/6708197; LastUpdated: 9/2/2020 1:27:51 AM; Lifecycle Status: Active; Minimum Order: 1; Mounting Type: Surface Mount; Operating Temperature: -55°C ~ 150°C (TJ); Package / Case: DO-214AC, SMA; Packaging: TapeAndReel; PartId: 7342; Part Status: Active; Price: 0.09; Series: -; Supplier 1: DigiKey; Supplier Part Number 1: P4SMA10CABBCT-ND; Supplier Device Package: DO-214AC (SMA); Voltage - Clamping (Max) @ Ipp: 14.5V; Voltage - Reverse Standoff (Typ): 8.55V
footprint DO214AC SMA
pins: 1, 2

## P4SMA10CA-E3/61
designator D?
TVS DIODE 8.55V 14.5V DO214AC; Manufacturer: Vishay Semiconductor Diodes Division; Bidirectional Channels: 1; Current - Peak Pulse (10/1000µs): 27.6A; Power Line Protection: No; Power - Peak Pulse: 400W; Type: Zener; Voltage - Breakdown (Min): 9.5V; Part Number: P4SMA10CA-E3/61; Applications: General Purpose; ComponentLink1Description: Datasheet; ComponentLink1URL: http://www.vishay.com/docs/88367/p4sma.pdf; ComponentLink2Description: DigiKey Link; ComponentLink2URL: http://digikey.com/product-detail/en/vishay-semiconductor-diodes-division/P4SMA10CA-E3-61/P4SMA10CA-E3-61GICT-ND/5639017; LastUpdated: 9/2/2020 1:27:53 AM; Lifecycle Status: Active; Minimum Order: 1; Mounting Type: Surface Mount; Operating Temperature: -65°C ~ 150°C (TJ); Package / Case: DO-214AC, SMA; Packaging: TapeAndReel; PartId: 7587; Part Status: Active; Price: 0.11; Series: P4SMA, TransZorb®; Supplier 1: DigiKey; Supplier Part Number 1: P4SMA10CA-E3/61GICT-ND; Supplier Device Package: DO-214AC (SMA); Voltage - Clamping (Max) @ Ipp: 14.5V; Voltage - Reverse Standoff (Typ): 8.55V
footprint DO214AC SMA
pins: 1, 2

## P4SMA11A
designator D?
TVS DIODE 9.4V 15.6V DO214AC; Manufacturer: Bourns Inc.; Current - Peak Pulse (10/1000µs): 26.3A; Power Line Protection: No; Power - Peak Pulse: 400W; Type: Zener; Unidirectional Channels: 1; Voltage - Breakdown (Min): 10.5V; Part Number: P4SMA11A; Applications: General Purpose; ComponentLink1Description: Datasheet; ComponentLink1URL: https://www.bourns.com/docs/Product-Datasheets/P4SMA.pdf; ComponentLink2Description: DigiKey Link; ComponentLink2URL: http://digikey.com/product-detail/en/bourns-inc/P4SMA11A/P4SMA11ABBCT-ND/6708198; LastUpdated: 9/2/2020 1:20:18 AM; Lifecycle Status: Active; Minimum Order: 1; Mounting Type: Surface Mount; Operating Temperature: -55°C ~ 150°C (TJ); Package / Case: DO-214AC, SMA; Packaging: TapeAndReel; PartId: 6144; Part Status: Active; Price: 0.09; Series: -; Supplier 1: DigiKey; Supplier Part Number 1: P4SMA11ABBCT-ND; Supplier Device Package: DO-214AC (SMA); Voltage - Clamping (Max) @ Ipp: 15.6V; Voltage - Reverse Standoff (Typ): 9.4V
footprint DO214AC SMA
pins: 1, 2

## P4SMA11CA
designator D?